# Altium footprint library My Library.PcbLib: 872 footprints (part 31 of 55)
Each footprint in its own frame and in the unit in brackets; x right, y up, seen from the top. Pads: shape width x height; smd on the part's side, far side on the other; paste and mask are expansions set on the pad; w line width, h text height; cw(c..) or ccw(c..) is an arc to the next point about the centre after c.
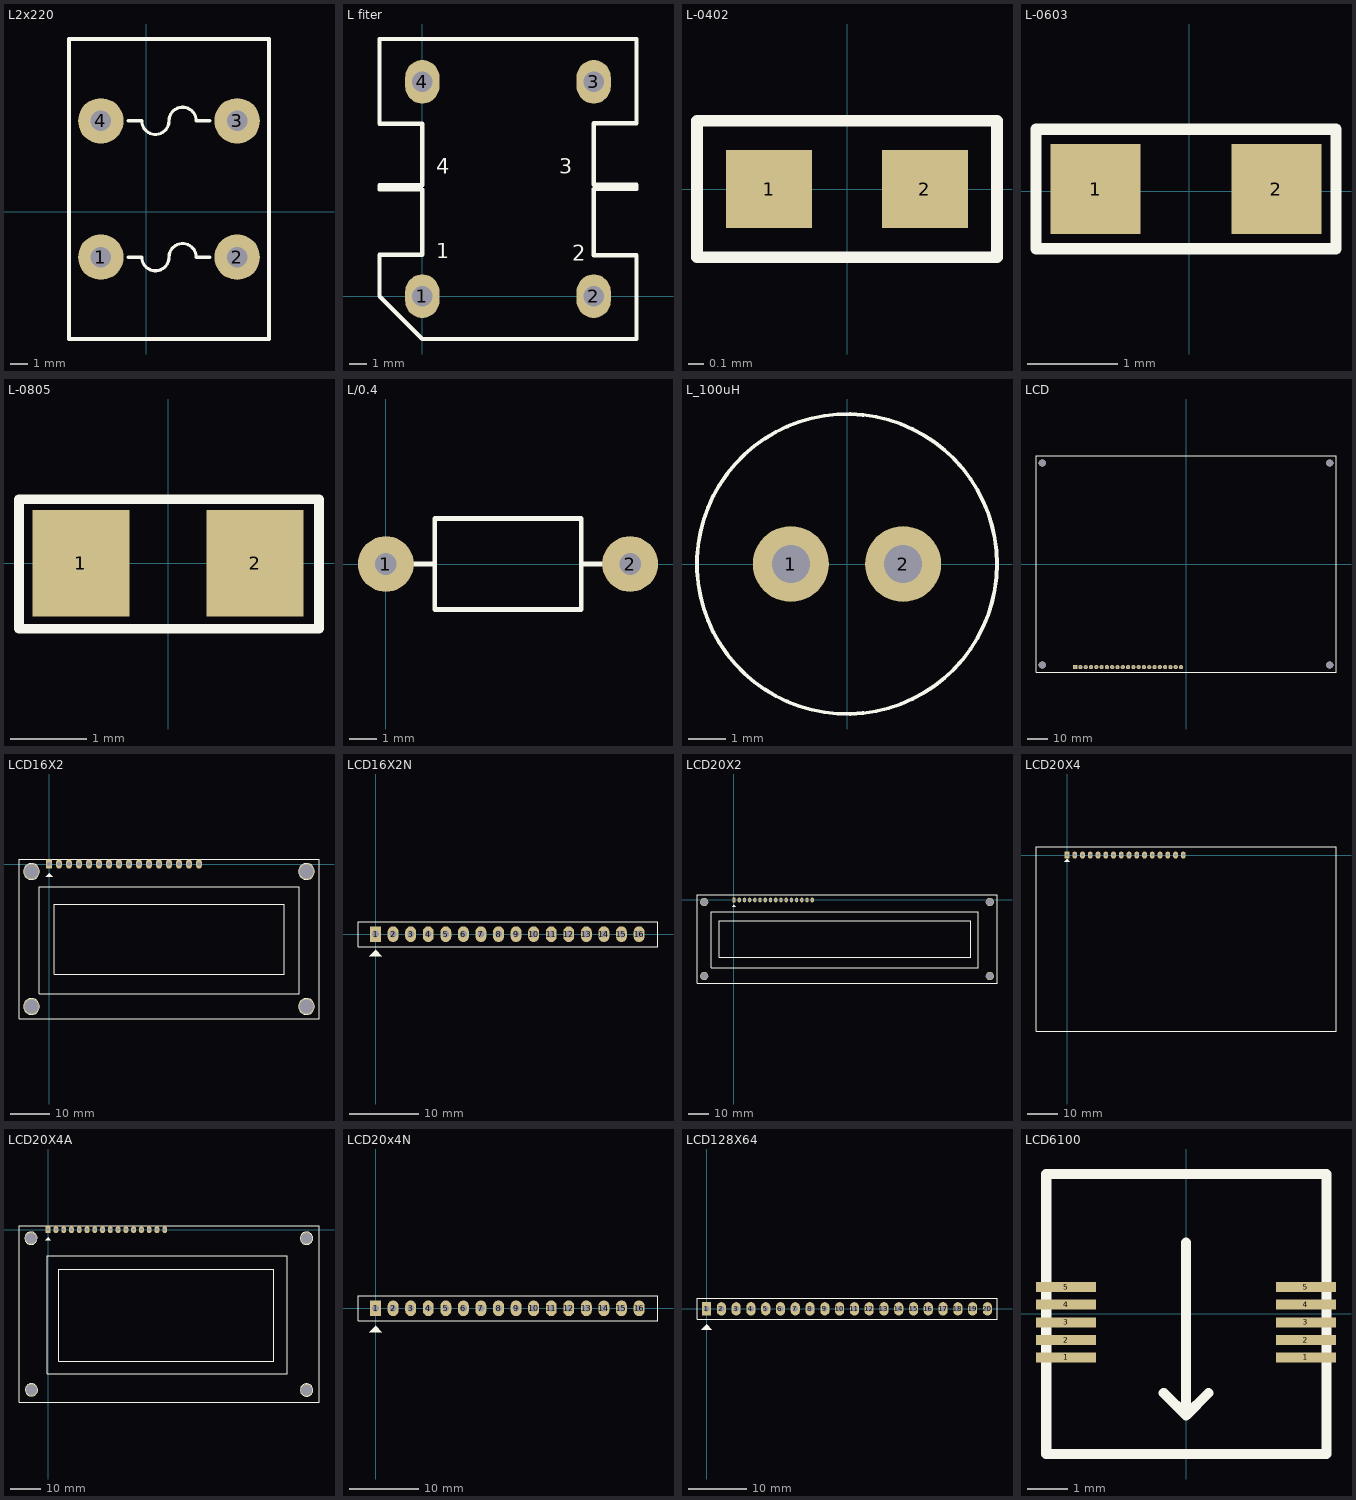
[diagram p30: the footprints below, top view; thin cyan lines are the x and y axes]

## L2x220 [mil] "Loc 220"
pads (4):
  round 100 hole 45: 1(-100,-100) 2(200,-100) 3(200,200) 4(-100,200)
Top Overlay:
  lines w7: -10,-100 ccw(c20,-100) 50,-100 cw(c80,-100) 110,-100 ; -10,200 ccw(c20,200) 50,200 cw(c80,200) 110,200
  lines w8: -40,-100 -10,-100 ; -40,200 -10,200 ; 110,-100 140,-100 ; 110,200 140,200 ; -170,-280 270,-280 270,380 -170,380 -170,-280

## L fiter [mm] "Fiter"
pads (4):
  oval 2x2.54 hole 1.2: 1(0,0) 2(10,0) 3(10,12.5) 4(0,12.5)
Top Overlay:
  lines w0.254: 12.5,-2.5 12.5,2.388 10,2.388 10,6.248 12.5,6.248 12.5,6.502 10,6.502 10,10.084 12.5,10.084 12.5,15 7.373,15 -2.5,15 -2.5,12.497 -2.5,10.058 0,10.058 0,6.477 -2.5,6.477 -2.5,6.223 0,6.223 0,2.413 -2.5,2.413 -2.5,0 0,-2.5 2,-2.5 ; 12.5,-2.5 8,-2.5 2,-2.5 ; 2,-2.5 2,-2.5
  text "2" at 8.755,1.778 h1.52
  text "1" at 0.803,1.905 h1.5
  text "3" at 8,6.86 h1.5
  text "4" at 0.803,6.86 h1.52
3D body: height 18, standoff 1.5, extent 2.616,10.484 3.378,14.929
3D body: height 18, standoff 1.5, extent 7.087,-2.426 7.849,2.019
3D body: height 18, standoff 1.5, extent 7.036,10.51 7.798,14.955
3D body: height 18, standoff 1.5, extent 2.591,-2.464 3.353,1.981
3D body: height 18, standoff 0, extent -2.523,1.823 12.477,2.223
3D body: height 18, standoff 0, extent -2.5,6.125 12.5,6.525
3D body: height 18, standoff 0, extent -2.478,10.189 12.522,10.589
3D body: height 4.5, standoff 1.5, extent -2.5,10.453 12.5,15
3D body: height 4.5, standoff 1.5, extent -2.5,-2.5 12.5,2
3D body: height 1.5, standoff 0, extent 4.5,-2.5 6,-1
3D body: height 1, standoff -4, extent -0.496,-0.499 0.5,0.499
3D body: height 1, standoff -4, extent 9.5,11.998 10.496,12.996
3D body: height 1, standoff -4, extent -0.499,11.997 0.499,12.993
3D body: height 1, standoff -4, extent 9.501,-0.496 10.499,0.5
3D body: height 21, standoff 10, extent 3.632,-2.515 6.807,15.037
3D body: height 15, standoff 9, extent 1.219,2.007 8.755,10.465

## L-0402 [mil]
pads (2):
  rect 22x20 smd: 1(-20,0) 2(20,0)
Top Overlay:
  lines w3: -38.5,-17.5 -38.5,17.5 38.5,17.5 38.5,-17.5 -38.5,-17.5
3D body "User Library-cap_0402.STEP": height 19.68, standoff 0, extent -19.68,-9.84 19.69,9.85

## L-0603 [mm] "Chip Capacitor; Body 1.6 x 0.8 mm (LxW typ)"
height 0.87
pads (2):
  rect 1x1 smd: 1(-1.041,0.025) 2(0.965,0.025)
Top Overlay:
  lines w0.127: -1.702,-0.635 -1.702,0.686 1.626,0.686 1.626,-0.635 -1.702,-0.635
3D body: height 0.51, standoff 0, extent 0.52,-0.375 0.78,0.429
3D body: height 0.51, standoff 0, extent -0.828,-0.376 -0.568,0.429
3D body: height 0.5, standoff 0, extent -0.825,-0.373 0.775,0.427

## L-0805 [mil] "Compoment SMD 80x50mil"
height 50
pads (2):
  rect 50x55 smd: 1(-45,0) 2(45,0)
Top Overlay:
  lines w5: -77,-34 -77,33 78,33 78,-34 -77,-34
3D body: height 39.37, standoff 0, extent -40,-20 40,20
3D body: height 43.31, standoff 0, extent -50,-20 -40,20
3D body: height 43.31, standoff 0, extent 40,-20 50,20

## L/0.4 [mil] "Inductor , 2 Pin, L 350mil, W 150 mil"
height 150
pads (2):
  round 80 hole 31: 1(0,0) 2(350,0)
Top Overlay:
  lines w7: 70,0 40,0 70,0 ; 70,0 70,65 280,65 280,0 ; 70,0 70,-65 280,-65 280,0 ; 280,0 310,0 280,0

## L_100uH [mil]
pads (2):
  round 80 hole 40: 1(-59.06,0) 2(59.06,0)
Top Overlay:
  circle w4: c0,0 r157.79
3D body: height 39.37, standoff -39.37, extent 43.33,-15.73 74.78,15.73
3D body: height 39.37, standoff -39.37, extent -74.78,-15.73 -43.33,15.73
3D body: height 358.27, standoff 314.96, extent -110.22,-110.22 110.22,110.22
3D body: height 354.33, standoff 0, extent -137.78,-137.78 137.78,137.78

## LCD [mil]
pads (21):
  rect 80x80 hole 40: 1(-2094.49,-1948.82)
  round 80 hole 40: 2(-1994.49,-1948.82) 3(-1894.49,-1948.82) 4(-1794.49,-1948.82) 5(-1694.49,-1948.82) 6(-1594.49,-1948.82) 7(-1494.49,-1948.82) 8(-1394.49,-1948.82) 9(-1294.49,-1948.82) 10(-1194.49,-1948.82) 11(-1094.49,-1948.82) 12(-994.49,-1948.82) 13(-894.49,-1948.82) 14(-794.49,-1948.82) 15(-694.49,-1948.82) 16(-594.49,-1948.82) 17(-494.49,-1948.82) 18(-394.49,-1948.82) 19(-294.49,-1948.82) 20(-194.49,-1948.82) 21(-94.49,-1948.82)
via 2716.54,1909.45 diameter 137.8 hole 137.8
via -2716.54,1909.45 diameter 137.8 hole 137.8
via -2716.54,-1909.45 diameter 137.8 hole 137.8
via 2716.54,-1909.45 diameter 137.8 hole 137.8
Top Overlay:
  lines w10: -2834.65,-2047.24 -2834.65,2047.24 2834.65,2047.24 2834.65,-2047.24 -2834.65,-2047.24
3D body: height 437.01, standoff 433.07, extent -134.11,-2047.22 -55.12,-1908.6
3D body: height 437.01, standoff 433.07, extent -434.11,-2047.22 -355.12,-1908.6
3D body: height 437.01, standoff 433.07, extent -534.11,-2047.22 -455.12,-1908.6
3D body: height 437.01, standoff 433.07, extent -334.11,-2047.22 -255.12,-1908.6
3D body: height 437.01, standoff 433.07, extent -234.11,-2047.22 -155.12,-1908.6
3D body: height 437.01, standoff 433.07, extent -834.11,-2047.22 -755.12,-1908.6
3D body: height 437.01, standoff 433.07, extent -934.11,-2047.22 -855.12,-1908.6
3D body: height 437.01, standoff 433.07, extent -734.11,-2047.22 -655.12,-1908.6
3D body: height 437.01, standoff 433.07, extent -634.11,-2047.22 -555.12,-1908.6
3D body: height 437.01, standoff 433.07, extent -1234.11,-2047.22 -1155.12,-1908.6
3D body: height 437.01, standoff 433.07, extent -1334.11,-2047.22 -1255.12,-1908.6
3D body: height 437.01, standoff 433.07, extent -1134.11,-2047.22 -1055.12,-1908.6
3D body: height 437.01, standoff 433.07, extent -1034.11,-2047.22 -955.12,-1908.6
3D body: height 437.01, standoff 433.07, extent -1634.11,-2047.22 -1555.12,-1908.6
3D body: height 437.01, standoff 433.07, extent -1734.11,-2047.22 -1655.12,-1908.6
3D body: height 437.01, standoff 433.07, extent -1534.11,-2047.22 -1455.12,-1908.6
3D body: height 437.01, standoff 433.07, extent -1434.11,-2047.22 -1355.12,-1908.6
3D body: height 437.01, standoff 433.07, extent -1834.11,-2047.22 -1755.12,-1908.6
3D body: height 437.01, standoff 433.07, extent -1934.11,-2047.22 -1855.12,-1908.6
3D body: height 437.01, standoff 433.07, extent -2134.11,-2047.22 -2055.12,-1908.6
3D body: height 437.01, standoff 433.07, extent -2034.11,-2047.22 -1955.12,-1908.6
3D body: height 472.44, standoff -39.37, extent -607.5,-1962.5 -581,-1936
3D body: height 472.44, standoff -39.37, extent -507.5,-1962.5 -481,-1936
3D body: height 472.44, standoff -39.37, extent -307.5,-1962.5 -281,-1936
3D body: height 472.44, standoff -39.37, extent -407.5,-1962.5 -381,-1936
3D body: height 472.44, standoff -39.37, extent -107.5,-1962.5 -81,-1936
3D body: height 472.44, standoff -39.37, extent -207.5,-1962.5 -181,-1936
3D body: height 472.44, standoff -39.37, extent -1307.5,-1962.5 -1281,-1936
3D body: height 472.44, standoff -39.37, extent -1207.5,-1962.5 -1181,-1936
3D body: height 472.44, standoff -39.37, extent -1007.5,-1962.5 -981,-1936
3D body: height 472.44, standoff -39.37, extent -1107.5,-1962.5 -1081,-1936
3D body: height 472.44, standoff -39.37, extent -707.5,-1962.5 -681,-1936
3D body: height 472.44, standoff -39.37, extent -607.5,-1962.5 -581,-1936
3D body: height 472.44, standoff -39.37, extent -807.5,-1962.5 -781,-1936
3D body: height 472.44, standoff -39.37, extent -907.5,-1962.5 -881,-1936
3D body: height 472.44, standoff -39.37, extent -1707.5,-1962.5 -1681,-1936
3D body: height 472.44, standoff -39.37, extent -1607.5,-1962.5 -1581,-1936
3D body: height 472.44, standoff -39.37, extent -1407.5,-1962.5 -1381,-1936
3D body: height 472.44, standoff -39.37, extent -1507.5,-1962.5 -1481,-1936
3D body: height 472.44, standoff -39.37, extent -1907.5,-1962.5 -1881,-1936
3D body: height 472.44, standoff -39.37, extent -1807.5,-1962.5 -1781,-1936
3D body: height 472.44, standoff -39.37, extent -2007.5,-1962.5 -1981,-1936
3D body: height 472.44, standoff -39.37, extent -2107.5,-1962.5 -2081,-1936
3D body: height 393.7, standoff 0, extent -2154.98,-2009.31 -34,-1890.02
3D body: height 433.07, standoff 393.7, extent -2834.63,-2047.22 2834.63,2047.22
3D body: height 791.34, standoff 433.07, extent -2578.74,-1568.9 2578.74,1568.9
3D body: height 748.03, standoff 433.07, extent -2244.09,-1259.84 2244.09,1259.84
3D body: height 472.44, standoff 433.07, extent 2578.74,-196.85 2834.65,196.85
3D body: height 59.06, standoff 0, extent -2814.94,-2007.85 -2618.13,-1811.04
3D body: height 511.81, standoff -78.74, extent -2775.57,-1968.48 -2657.5,-1850.41
3D body: height 472.44, standoff 433.07, extent -2814.94,-2007.85 -2618.13,-1811.04
3D body: height 59.06, standoff 0, extent 2618.13,-2007.85 2814.94,-1811.04
3D body: height 511.81, standoff -78.74, extent 2657.5,-1968.48 2775.57,-1850.41
3D body: height 472.44, standoff 433.07, extent 2618.13,-2007.85 2814.94,-1811.04
3D body: height 59.06, standoff 0, extent 2618.13,1811.04 2814.94,2007.85
3D body: height 511.81, standoff -78.74, extent 2657.5,1850.41 2775.57,1968.48
3D body: height 472.44, standoff 433.07, extent 2618.13,1811.04 2814.94,2007.85
3D body: height 472.44, standoff 433.07, extent -2814.94,1811.04 -2618.13,2007.85
3D body: height 511.81, standoff -78.74, extent -2775.57,1850.41 -2657.5,1968.48
3D body: height 59.06, standoff 0, extent -2814.94,1811.04 -2618.13,2007.85

## LCD16X2 [mil] "LCD dipslay 16x2, 16 pin"
height 400
pads (20):
  rect 62x90 hole 36: 1(0,0)
  oval 62x90 hole 36: 2(100,0) 3(200,0) 4(300,0) 5(400,0) 6(500,0) 7(600,0) 8(700,0) 9(800,0) 10(900,0) 11(1000,0) 12(1100,0) 13(1200,0) 14(1300,0) 15(1400,0) 16(1500,0)
  round 157.48 hole 137.8: "Hole 0"(-175,-1425) "Hole 0"(-175,-75) "Hole 0"(2575,-1425) "Hole 0"(2575,-75)
Top Overlay:
  circle w7: c-175,-1425 r79.06
  circle w7: c-175,-75 r79.06
  circle w7: c2575,-75 r79.06
  circle w7: c2575,-1425 r79.06
  region: 0,-90 -35,-125 35,-125
  lines w7: -300,-1550 2700,-1550 2700,50 -300,50 -300,-1550 ; -100,-1300 2500,-1300 2500,-225 -100,-225 -100,-1300 ; 50,-1100 2350,-1100 2350,-400 50,-400 50,-1100
3D body "LCD module 16 X 2 backlight.STEP": height 414, standoff -106, extent -314.65,-1360 2854.65,77.01

## LCD16X2N [mil] "LCD dipslay 16x2, 16 pin"
height 400
pads (16):
  rect 62x90 hole 39: 1(0,0)
  oval 62x90 hole 39: 2(100,0) 3(200,0) 4(300,0) 5(400,0) 6(500,0) 7(600,0) 8(700,0) 9(800,0) 10(900,0) 11(1000,0) 12(1100,0) 13(1200,0) 14(1300,0) 15(1400,0) 16(1500,0)
Top Overlay:
  region: 0,-90 -35,-125 35,-125
  lines w7: -100,-71 -100,70 1608,70 1608,-71 -100,-71
3D body "socket16.stp": height 276.19, standoff -117.51, extent -50,-44.99 1550,55.01
3D body "jp16.stp": height 468.11, standoff -20.08, extent -48.03,-48.43 1548.03,50
3D body "lcd16.STEP": height 764, standoff 244, extent -319.64,-1353.49 2849.65,83.51

## LCD20X2 [mil] "LCD dipslay 20x2, 16 pin"
height 400
pads (20):
  rect 62x90 hole 36: 1(0,0)
  oval 62x90 hole 36: 2(100,0) 3(200,0) 4(300,0) 5(400,0) 6(500,0) 7(600,0) 8(700,0) 9(800,0) 10(900,0) 11(1000,0) 12(1100,0) 13(1200,0) 14(1300,0) 15(1400,0) 16(1500,0)
  round 157.48 hole 137.8: "Hole 0"(-570.87,-1456.69) "Hole 0"(-570.87,-39.37) "Hole 0"(4901.57,-1456.69) "Hole 0"(4901.57,-39.37)
Top Overlay:
  region: 0,-90 -35,-125 35,-125
  lines w7: -708.66,-1594.49 5039.37,-1594.49 5039.37,100 -708.66,100 -708.66,-1594.49 ; -436,-1300 4682,-1300 4682,-225 -436,-225 -436,-1300 ; -286,-1100 4532,-1100 4532,-400 -286,-400 -286,-1100
3D body "SW3dPS-Display20x2.STEP": height 198, standoff -180, extent -100,-1437 4470,33

## LCD20X4 [mil]
height 400
pads (16):
  rect 62x90 hole 39: 1(0,0)
  oval 62x90 hole 39: 2(100,0) 3(200,0) 4(300,0) 5(400,0) 6(500,0) 7(600,0) 8(700,0) 9(800,0) 10(900,0) 11(1000,0) 12(1100,0) 13(1200,0) 14(1300,0) 15(1400,0) 16(1500,0)
Top Overlay:
  region: 0,-50 -35,-85 35,-85
  lines w7: -400,-2270 3470,-2270 3470,105 -400,105 -400,-2270
3D body "User Library-LCD 4X20.STEP": height 543.81, standoff -243.59, extent -393.94,-2261.89 3464.33,100.31

## LCD20X4A [mil] "LCD dipslay 20x4, 16 pin"
height 400
pads (20):
  rect 62x90 hole 39: 1(0,0)
  oval 62x90 hole 39: 2(100,0) 3(200,0) 4(300,0) 5(400,0) 6(500,0) 7(600,0) 8(700,0) 9(800,0) 10(900,0) 11(1000,0) 12(1100,0) 13(1200,0) 14(1300,0) 15(1400,0) 16(1500,0)
  round 157.48 hole 137.8: "Hole 0"(-220,-110) "Hole 0"(-215,-2060) "Hole 0"(3325,-2065) "Hole 0"(3325,-110)
Top Overlay:
  circle w7: c3324.94,-2063 r79.06
  circle w7: c3324.94,-110 r79.06
  circle w7: c-221.06,-110 r79.06
  circle w7: c-215.06,-2061 r79.06
  region: 0,-100 -35,-135 35,-135
  lines w7: -375,-2220 -375,50 3485,50 3485,-2220 -374,-2220 ; -11,-1852 -11,-337 3076,-337 3076,-1852 -11,-1852 ; 139,-1695 139,-512 2905,-512 2905,-1695 139,-1695
3D body "User Library-LCD20_4.STEP": height 417.32, standoff -125.98, extent -392.13,-2264.2 3466.13,98

## LCD20x4N [mil] "LCD dipslay 20x4, 16 pin"
height 400
pads (16):
  rect 62x90 hole 39: 1(0,0)
  oval 62x90 hole 39: 2(100,0) 3(200,0) 4(300,0) 5(400,0) 6(500,0) 7(600,0) 8(700,0) 9(800,0) 10(900,0) 11(1000,0) 12(1100,0) 13(1200,0) 14(1300,0) 15(1400,0) 16(1500,0)
Top Overlay:
  region: 0,-100 -35,-135 35,-135
  lines w7: -100,-71 1608,-71 1608,70 -100,70 -100,-71
3D body "User Library-LCD20_4.STEP": height 417.32, standoff -125.98, extent -392,-2265.2 3466.27,97

## LCD128X64 [mil] "LCD Graphic 128x64, 20 pin"
height 400
pads (20):
  rect 62x90 hole 39: 1(0,0)
  oval 62x90 hole 39: 2(100,0) 3(200,0) 4(300,0) 5(400,0) 6(500,0) 7(600,0) 8(700,0) 9(800,0) 10(900,0) 11(1000,0) 12(1100,0) 13(1200,0) 14(1300,0) 15(1400,0) 16(1500,0) 17(1600,0) 18(1700,0) 19(1800,0) 20(1900,0)
Top Overlay:
  region: 0,-105 -35,-140 35,-140
  lines w7: -65,-71 -65,70 1965,70 1965,-71 -65,-71
3D body "User Library-GRAPHIC LCD WG12864B.STEP": height 475.59, standoff -130.71, extent -612.8,-2069.98 2536.8,56

## LCD6100 [mm]
pads (10):
  rect 1.5x0.25 smd: 1(-3,-1.091) 1(2.994,-1.091) 2(-3,-0.66) 2(2.994,-0.66) 3(-3,-0.215) 3(2.994,-0.215) 4(-3,0.229) 4(2.994,0.229) 5(-3,0.661) 5(2.994,0.661)
Top Overlay:
  lines w0.254: -0.559,-1.981 0,-2.54 ; 0,1.778 0,-2.54 ; 0.559,-1.981 0,-2.54 ; -3.493,-3.507 -3.493,3.493 3.507,3.493 3.507,-3.507 -3.493,-3.507